# Altium footprint library mastermind.PCBLIB: 1061 footprints (part 11 of 67)
Each footprint in its own frame and in the unit in brackets; x right, y up, seen from the top. Pads: shape width x height; smd on the part's side, far side on the other; paste and mask are expansions set on the pad; w line width, h text height; cw(c..) or ccw(c..) is an arc to the next point about the centre after c.
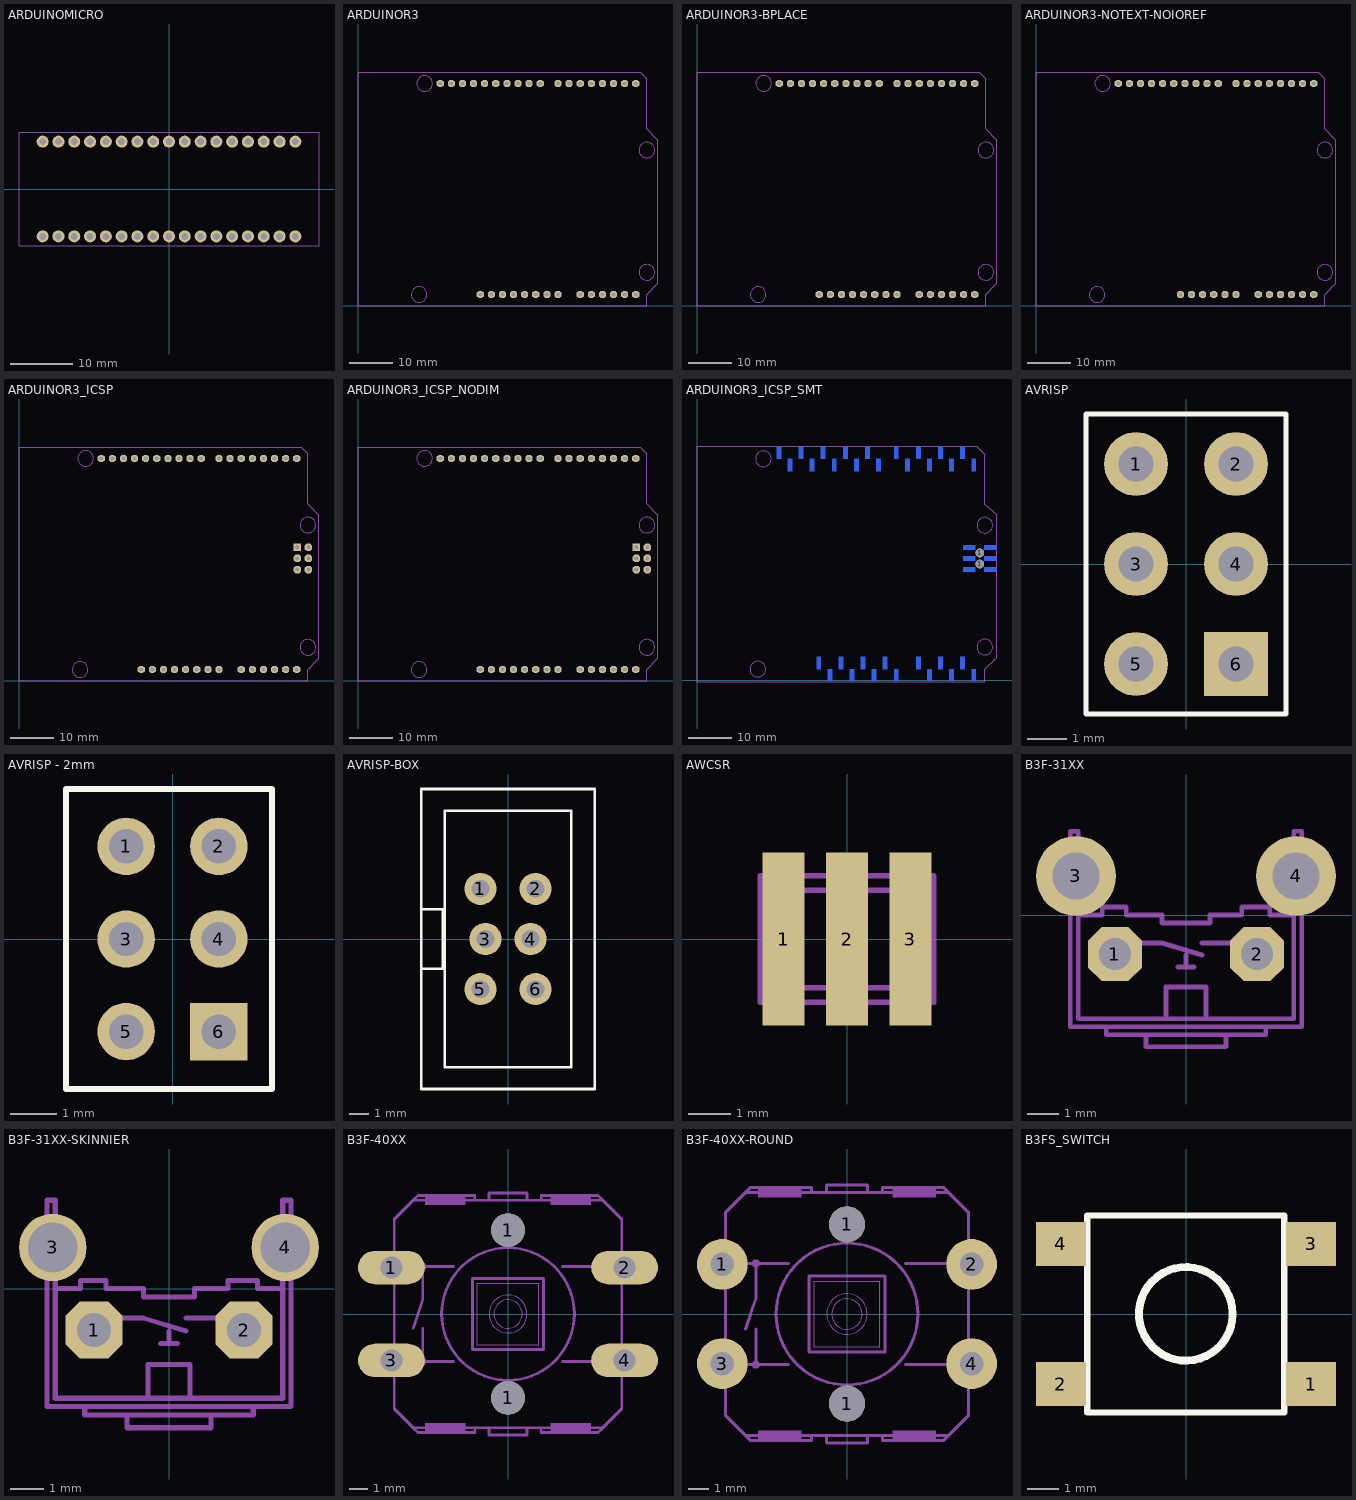
[diagram p10: the footprints below, top view; thin cyan lines are the x and y axes]

## ARDUINOMICRO [mil]
pads (34):
  round 76 hole 43.31: P$1(-800,300) P$2(-700,300) P$3(-600,300) P$4(-500,300) P$5(-400,300) P$6(-300,300) P$7(-200,300) P$8(-100,300) P$9(0,300) P$10(100,300) P$11(200,300) P$12(500,-300) P$13(400,-300) P$14(500,300) P$15(600,300) P$16(700,300) P$17(800,300) P$18(800,-300) P$19(700,-300) P$20(600,-300) P$21(300,300) P$22(400,300) P$23(300,-300) P$24(200,-300) P$25(100,-300) P$26(0,-300) P$27(-100,-300) P$28(-200,-300) P$29(-300,-300) P$30(-400,-300) P$31(-500,-300) P$32(-600,-300) P$33(-700,-300) P$34(-800,-300)
Mechanical 2:
  lines w5: -950,-360 -950,360 950,360 950,-360 -950,-360

## ARDUINOR3 [mm]
pads (32):
  oct 1.623x1.623 hole 1: 3V(35.56,2.54) 5V(38.1,2.54) A0(50.8,2.54) A1(53.34,2.54) A2(55.88,2.54) A3(58.42,2.54) A4(60.96,2.54) A5(63.5,2.54) AREF(23.876,50.8) D0(63.5,50.8) D1(60.96,50.8) D2(58.42,50.8) D3(55.88,50.8) D4(53.34,50.8) D5(50.8,50.8) D6(48.26,50.8) D7(45.72,50.8) D8(41.656,50.8) D9(39.116,50.8) D10(36.576,50.8) D11(34.036,50.8) D12(31.496,50.8) D13(28.956,50.8) GND(26.416,50.8) GND1(43.18,2.54) GND2(40.64,2.54) IOREF(30.48,2.54) RESERVED(27.94,2.54) RESET(33.02,2.54) SCL(18.796,50.8) SDA(21.336,50.8) VIN(45.72,2.54)
Mechanical 1:
  lines w0: 0,0 66.04,0 66.04,2.54 68.58,5.08 68.58,37.846 66.04,40.386 66.04,51.816 64.516,53.34 0,53.34 0,0
Mechanical 8:
  circle w0.127: c15.24,50.8 r1.796
  circle w0.127: c13.97,2.54 r1.796
  circle w0.127: c66.04,35.56 r1.796
  circle w0.127: c66.04,7.62 r1.796

## ARDUINOR3-BPLACE [mm]
pads (32):
  oct 1.623x1.623 hole 1: 3V(35.56,2.54) 5V(38.1,2.54) A0(50.8,2.54) A1(53.34,2.54) A2(55.88,2.54) A3(58.42,2.54) A4(60.96,2.54) A5(63.5,2.54) AREF(23.876,50.8) D0(63.5,50.8) D1(60.96,50.8) D2(58.42,50.8) D3(55.88,50.8) D4(53.34,50.8) D5(50.8,50.8) D6(48.26,50.8) D7(45.72,50.8) D8(41.656,50.8) D9(39.116,50.8) D10(36.576,50.8) D11(34.036,50.8) D12(31.496,50.8) D13(28.956,50.8) GND(26.416,50.8) GND1(43.18,2.54) GND2(40.64,2.54) IOREF(30.48,2.54) RESERVED(27.94,2.54) RESET(33.02,2.54) SCL(18.796,50.8) SDA(21.336,50.8) VIN(45.72,2.54)
Mechanical 3:
  lines w0: 0,0 0,53.34 64.516,53.34 66.04,51.816 66.04,40.386 68.58,37.846 68.58,5.08 66.04,2.54 66.04,0 0,0
Mechanical 8:
  circle w0.127: c66.04,7.62 r1.796
  circle w0.127: c66.04,35.56 r1.796
  circle w0.127: c13.97,2.54 r1.796
  circle w0.127: c15.24,50.8 r1.796

## ARDUINOR3-NOTEXT-NOIOREF [mm]
pads (30):
  oct 1.623x1.623 hole 1: 3V(35.56,2.54) 5V(38.1,2.54) A0(50.8,2.54) A1(53.34,2.54) A2(55.88,2.54) A3(58.42,2.54) A4(60.96,2.54) A5(63.5,2.54) AREF(23.876,50.8) D0(63.5,50.8) D1(60.96,50.8) D2(58.42,50.8) D3(55.88,50.8) D4(53.34,50.8) D5(50.8,50.8) D6(48.26,50.8) D7(45.72,50.8) D8(41.656,50.8) D9(39.116,50.8) D10(36.576,50.8) D11(34.036,50.8) D12(31.496,50.8) D13(28.956,50.8) GND(26.416,50.8) GND1(43.18,2.54) GND2(40.64,2.54) RESET(33.02,2.54) SCL(18.796,50.8) SDA(21.336,50.8) VIN(45.72,2.54)
Mechanical 3:
  lines w0: 0,0 0,53.34 64.516,53.34 66.04,51.816 66.04,40.386 68.58,37.846 68.58,5.08 66.04,2.54 66.04,0 0,0
Mechanical 8:
  circle w0.127: c66.04,7.62 r1.796
  circle w0.127: c66.04,35.56 r1.796
  circle w0.127: c13.97,2.54 r1.796
  circle w0.127: c15.24,50.8 r1.796

## ARDUINOR3_ICSP [mm]
pads (38):
  oct 1.623x1.623 hole 1: 3V(35.56,2.54) 5V(38.1,2.54) A0(50.8,2.54) A1(53.34,2.54) A2(55.88,2.54) A3(58.42,2.54) A4(60.96,2.54) A5(63.5,2.54) AREF(23.876,50.8) D0(63.5,50.8) D1(60.96,50.8) D2(58.42,50.8) D3(55.88,50.8) D4(53.34,50.8) D5(50.8,50.8) D6(48.26,50.8) D7(45.72,50.8) D8(41.656,50.8) D9(39.116,50.8) D10(36.576,50.8) D11(34.036,50.8) D12(31.496,50.8) D13(28.956,50.8) GND(26.416,50.8) GND@1(43.18,2.54) GND@2(40.64,2.54) IOREF(30.48,2.54) RESERVED(27.94,2.54) RESET(33.02,2.54) SCL(18.796,50.8) SDA(21.336,50.8) VIN(45.72,2.54)
  oct 1.722x1.722 hole 1: 5V_ICSP(66.167,30.48) GND@3(66.167,25.4) MOSI(66.167,27.94) RESET_ICSP(63.627,25.4) SCK(63.627,27.94)
  rect 1.778x1.778 hole 1: MISO(63.627,30.48)
Mechanical 1:
  lines w0: 0,0 0,53.34 64.516,53.34 66.04,51.816 66.04,40.386 68.58,37.846 68.58,5.08 66.04,2.54 66.04,0 0,0
Mechanical 8:
  circle w0.127: c66.04,7.62 r1.796
  circle w0.127: c66.04,35.56 r1.796
  circle w0.127: c13.97,2.54 r1.796
  circle w0.127: c15.24,50.8 r1.796

## ARDUINOR3_ICSP_NODIM [mm]
pads (38):
  oct 1.623x1.623 hole 1: 3V(35.56,2.54) 5V(38.1,2.54) A0(50.8,2.54) A1(53.34,2.54) A2(55.88,2.54) A3(58.42,2.54) A4(60.96,2.54) A5(63.5,2.54) AREF(23.876,50.8) D0(63.5,50.8) D1(60.96,50.8) D2(58.42,50.8) D3(55.88,50.8) D4(53.34,50.8) D5(50.8,50.8) D6(48.26,50.8) D7(45.72,50.8) D8(41.656,50.8) D9(39.116,50.8) D10(36.576,50.8) D11(34.036,50.8) D12(31.496,50.8) D13(28.956,50.8) GND(26.416,50.8) GND@1(43.18,2.54) GND@2(40.64,2.54) IOREF(30.48,2.54) RESERVED(27.94,2.54) RESET(33.02,2.54) SCL(18.796,50.8) SDA(21.336,50.8) VIN(45.72,2.54)
  oct 1.722x1.722 hole 1: 5V_ICSP(66.167,30.48) GND@3(66.167,25.4) MOSI(66.167,27.94) RESET_ICSP(63.627,25.4) SCK(63.627,27.94)
  rect 1.778x1.778 hole 1: MISO(63.627,30.48)
Mechanical 8:
  circle w0.127: c66.04,7.62 r1.796
  circle w0.127: c66.04,35.56 r1.796
  circle w0.127: c13.97,2.54 r1.796
  circle w0.127: c15.24,50.8 r1.796
  lines w0: 0,0 0,53.34 64.516,53.34 66.04,51.816 66.04,40.386 68.58,37.846 68.58,5.08 66.04,2.54 66.04,0 0,0

## ARDUINOR3_ICSP_SMT [mil]
pads (40):
  round 78.74 hole 78.74: 1(2555,1050) 1(2555,1150)
  rect 40x110 smd far side: 3V(1400,45) 5V(1500,155) A0(2000,155) A1(2100,45) A2(2200,155) A3(2300,45) A4(2400,155) A5(2500,45) AREF(940,2055) D0(2500,1945) D1(2400,2055) D2(2300,1945) D3(2200,2055) D4(2100,1945) D5(2000,2055) D6(1900,1945) D7(1800,2055) D8(1640,1945) D9(1540,2055) D10(1440,1945) D11(1340,2055) D12(1240,1945) D13(1140,2055) GND(1040,1945) GND@1(1700,155) GND@2(1600,45) IOREF(1200,45) RESERVED(1100,155) RESET(1300,155) SCL(740,2055) SDA(840,1945) VIN(1800,45)
  rect 110x40 smd far side: 5V_ICSP(2650,1200) GND@3(2650,1000) MISO(2460,1200) MOSI(2650,1100) RESET_ICSP(2460,1000) SCK(2460,1100)
Mechanical 8:
  circle w5: c2600,300 r70.71
  circle w5: c2600,1400 r70.71
  circle w5: c550,100 r70.71
  circle w5: c600,2000 r70.71
  lines w0: 0,-15 0,2115 2525,2115 2600,2040 2600,1590 2710,1495 2710,205 2600,100 2600,-15 0,-15

## AVRISP [mil]
pads (6):
  round 64 hole 35.43: 1(-50,100) 2(50,100) 3(-50,0) 4(50,0) 5(-50,-100)
  rect 64x64 hole 35.43: 6(50,-100)
Top Overlay:
  lines w5: 100,-70 100,-150 -100,-150 -100,-70 -100,30 -100,150 100,150 ; 100,-70 100,30 ; 100,-70 100,30 ; 100,30 100,150 ; 100,30 100,150

## AVRISP - 2mm [mm]
pads (6):
  round 1.24 hole 0.74: 1(-1,2) 2(1,2) 3(-1,0) 4(1,0) 5(-1,-2)
  rect 1.24x1.24 hole 0.74: 6(1,-2)
Top Overlay:
  lines w0.127: -2.299,-3.238 -2.299,3.238 2.146,3.238 2.146,-3.238 -2.299,-3.238

## AVRISP-BOX [mil]
pads (6):
  round 64 hole 35.43: 1(-55,100) 2(55,100) 3(-45,0) 4(45,0) 5(-55,-100) 6(55,-100)
Top Overlay:
  lines w5: -173.23,-59.06 -173.23,59.06 ; -173.23,-59.06 -173.23,-299.21 173.23,-299.21 173.23,299.21 -173.23,299.21 -173.23,59.06 ; -173.23,-59.06 -129.92,-59.06 -129.92,59.06 -173.23,59.06 ; -125.98,-255.91 125.98,-255.91 125.98,255.91 -125.98,255.91 -125.98,-255.91

## AWCSR [mm]
pads (3):
  rect 1x4.1 smd: 1(-1.5,0) 2(0,0) 3(1.5,0)
Mechanical 2:
  lines w0.127: -1.9,-1.45 -1.9,-1.2 ; -1.9,1.2 -1.9,1.5 ; -1.1,-1.45 -1.1,-1.2 ; -0.4,-1.45 -0.4,-1.15 ; -0.4,1.2 -0.4,1.5 ; 0.4,-1.45 0.4,-1.2 ; 0.4,1.2 0.4,1.5 ; 1.1,-1.45 1.1,-1.2 ; 1.1,1.2 1.1,1.5 ; 1.9,-1.45 1.9,-1.2 ; 1.9,1.2 1.9,1.5 ; -1.9,1.5 -1.7,1.5 ccw(c-1.5,1.5) -1.3,1.5 -1.1,1.5 ; -1.9,1.5 -2.05,1.5 -2.05,-1.5 -1.7,-1.5 cw(c-1.5,-1.5) -1.3,-1.5 -0.2,-1.5 cw(c0,-1.5) 0.2,-1.5 1.3,-1.5 cw(c1.5,-1.5) 1.7,-1.5 2.05,-1.5 2.05,1.5 1.9,1.5 ; -1.1,1.15 -1.1,1.5 ; -1.1,1.15 -1.9,1.15 ccw(c-1.9,1.05) -2,1.05 -2,-0.95 ccw(c-1.8,-0.95) -1.8,-1.15 -0.4,-1.15 ; -1.1,1.15 1.85,1.15 cw(c1.85,1) 2,1 2,-1.05 cw(c1.85,-1) 1.8,-1.15 -0.4,-1.15 ; -1.1,1.5 -0.4,1.5 ; -0.4,1.5 -0.2,1.5 ccw(c0,1.5) 0.2,1.5 0.4,1.5 ; 0.4,1.5 1.1,1.5 ; 1.1,1.5 1.3,1.5 ccw(c1.5,1.5) 1.7,1.5 1.9,1.5

## B3F-31XX [mil]
pads (4):
  oct 67.78x67.78 hole 40: 1(-89,-49) 2(89,-49)
  round 100 hole 59: 3(-138,49) 4(138,49)
Mechanical 2:
  lines w6: -145,0 -145,-140 100,-140 ; -135,-80 -135,-130 -25,-130 ; -135,-20 -135,0 -105,0 -105,10 -75,10 -75,0 -30,0 -30,-10 30,-10 30,0 70,0 70,10 105,10 105,0 135,0 135,-20 ; -100,-140 -100,-150 -50,-150 ; 135,-80 135,-130 25,-130 ; 145,0 145,-140 100,-140 ; -50,-150 50,-150 ; -50,-150 -50,-165 50,-165 50,-150 ; -25,-130 25,-130 ; -25,-130 -25,-90 25,-90 25,-130 ; 50,-150 100,-150 100,-140
Mechanical 8:
  lines w6: -145,0 -145,105 -135,105 -135,0 ; -135,-80 -135,-20 ; -65,-35 -30,-35 20,-50 ; -10,-65 0,-65 ; 0,-50 0,-65 ; 10,-65 0,-65 ; 20,-35 65,-35 ; 135,-80 135,-20 ; 135,0 135,105 145,105 145,0

## B3F-31XX-SKINNIER [mil]
pads (4):
  oct 67.78x67.78 hole 40: 1(-89,-49) 2(89,-49)
  round 80 hole 59: 3(-138,49) 4(138,49)
Mechanical 2:
  lines w6: -145,0 -145,-140 100,-140 ; -135,-80 -135,-130 -25,-130 ; -135,-20 -135,0 -105,0 -105,10 -75,10 -75,0 -30,0 -30,-10 30,-10 30,0 70,0 70,10 105,10 105,0 135,0 135,-20 ; -100,-140 -100,-150 -50,-150 ; 135,-80 135,-130 25,-130 ; 145,0 145,-140 100,-140 ; -50,-150 -50,-165 50,-165 50,-150 ; -50,-150 50,-150 ; -25,-130 -25,-90 25,-90 25,-130 ; -25,-130 25,-130 ; 50,-150 100,-150 100,-140
Mechanical 8:
  lines w6: -145,0 -145,105 -135,105 -135,0 ; -135,-80 -135,-20 ; -65,-35 -30,-35 20,-50 ; -10,-65 0,-65 ; 0,-50 0,-65 ; 10,-65 0,-65 ; 20,-35 65,-35 ; 135,-80 135,-20 ; 135,0 135,105 145,105 145,0

## B3F-40XX [mil]
pads (6):
  oval 141x70.5 hole 47: 1(-246,98) 2(246,98) 3(-246,-98) 4(246,-98)
  round 71 hole 71: 1(0,-177) 1(0,177)
Mechanical 2:
  circle w6: c0,0 r140
  circle w2: c0,0 r40
  circle w2: c0,0 r30
  region: 90,230 90,250 175,250 175,230
  region: -175,230 -175,250 -90,250 -90,230
  region: 90,-250 90,-230 175,-230 175,-250
  region: -175,-250 -175,-230 -90,-230 -90,-250
  lines w2: -65,-65 65,-65 65,65 -65,65 -65,-65
  lines w6: -240,-150 -240,-200 -200,-240 ; -240,-45 -240,45 ; -240,150 -240,200 -200,240 ; 240,-150 240,-200 200,-240 ; 240,-45 240,45 ; 240,150 240,200 200,240 ; -200,-240 -70,-240 ; -200,-240 -190,-250 -70,-250 -70,-240 ; -200,240 -70,240 ; -200,240 -190,250 -70,250 -70,240 ; -70,-240 -40,-240 ; -70,240 -40,240 ; -40,-240 -40,-255 40,-255 40,-240 ; -40,-240 40,-240 ; -40,240 -40,255 40,255 40,240 ; -40,240 40,240 ; 40,-240 70,-240 ; 40,240 70,240 ; 70,-240 70,-250 190,-250 200,-240 ; 70,-240 200,-240 ; 70,240 200,240 ; 70,240 70,250 190,250 200,240 ; -75,-75 75,-75 75,75 -75,75 -75,-75
Mechanical 8:
  circle w6: c-180,100 r5
  circle w6: c-180,-100 r5
  region: 240,-115 240,-80 260,-80 260,-115
  region: 240,80 240,115 260,115 260,80
  region: -260,80 -260,115 -240,115 -240,80
  region: -260,-115 -260,-80 -240,-80 -240,-115
  lines w6: -240,-150 -240,-45 ; -240,45 -240,150 ; -200,-100 -180,-100 ; -200,-30 -180,30 -180,100 ; -200,100 -180,100 ; -180,-30 -180,-100 ; -115,-100 -180,-100 ; -115,100 -180,100 ; 115,-100 200,-100 ; 115,100 200,100 ; 240,-150 240,-45 ; 240,45 240,150

## B3F-40XX-ROUND [mil]
pads (6):
  round 100 hole 47: 1(-246,98) 2(246,98) 3(-246,-98) 4(246,-98)
  round 71 hole 71: 1(0,-177) 1(0,177)
Mechanical 2:
  circle w2: c0,0 r30
  circle w2: c0,0 r40
  circle w6: c0,0 r140
  region: -175,-250 -175,-230 -90,-230 -90,-250
  region: 90,-250 90,-230 175,-230 175,-250
  region: -175,230 -175,250 -90,250 -90,230
  region: 90,230 90,250 175,250 175,230
  lines w2: -65,-65 -65,65 65,65 65,-65 -65,-65
  lines w6: -240,-150 -240,-200 -200,-240 ; -240,-45 -240,45 ; -240,150 -240,200 -200,240 ; 240,-150 240,-200 200,-240 ; 240,-45 240,45 ; 240,150 240,200 200,240 ; -200,-240 -190,-250 -70,-250 -70,-240 ; -200,-240 -70,-240 ; -200,240 -190,250 -70,250 -70,240 ; -200,240 -70,240 ; -70,-240 -40,-240 ; -70,240 -40,240 ; -40,-240 40,-240 ; -40,-240 -40,-255 40,-255 40,-240 ; -40,240 40,240 ; -40,240 -40,255 40,255 40,240 ; 40,-240 70,-240 ; 40,240 70,240 ; 70,-240 200,-240 ; 70,-240 70,-250 190,-250 200,-240 ; 70,240 70,250 190,250 200,240 ; 70,240 200,240 ; -75,-75 -75,75 75,75 75,-75 -75,-75
Mechanical 8:
  circle w6: c-180,-100 r5
  circle w6: c-180,100 r5
  region: -260,-115 -260,-80 -240,-80 -240,-115
  region: -260,80 -260,115 -240,115 -240,80
  region: 240,80 240,115 260,115 260,80
  region: 240,-115 240,-80 260,-80 260,-115
  lines w6: -240,-150 -240,-45 ; -240,45 -240,150 ; -200,-100 -180,-100 ; -200,-30 -180,30 -180,100 ; -200,100 -180,100 ; -180,-30 -180,-100 ; -115,-100 -180,-100 ; -115,100 -180,100 ; 115,-100 200,-100 ; 115,100 200,100 ; 240,-150 240,-45 ; 240,45 240,150

## B3FS_SWITCH [mm]
pads (4):
  rect 1.6x1.4 smd: 1(3.998,-2.244) 2(-4.012,-2.244) 3(3.998,2.246) 4(-4.012,2.246)
Top Overlay:
  circle w0.254: c-0.012,0.006 r1.5
  lines w0.2: -3.172,-3.154 3.138,-3.154 3.138,3.156 -3.172,3.156 -3.172,-3.154
3D body: height 2.5, standoff 0, extent -3.171,-3.154 3.138,3.155
3D body: height 0.76, standoff 0, extent -4.572,-2.667 -2.794,-1.778
3D body: height 0.76, standoff 0, extent 2.794,1.778 4.572,2.667
3D body: height 0.76, standoff 0, extent 2.794,-2.667 4.572,-1.778
3D body: height 0.76, standoff 0, extent -4.572,1.778 -2.794,2.667
3D body: height 4.57, standoff 0, extent -1.511,-1.494 1.488,1.505